# Altium footprint library Binh.PcbLib: 863 footprints (part 42 of 54)
Each footprint in its own frame and in the unit in brackets; x right, y up, seen from the top. Pads: shape width x height; smd on the part's side, far side on the other; paste and mask are expansions set on the pad; w line width, h text height; cw(c..) or ccw(c..) is an arc to the next point about the centre after c.
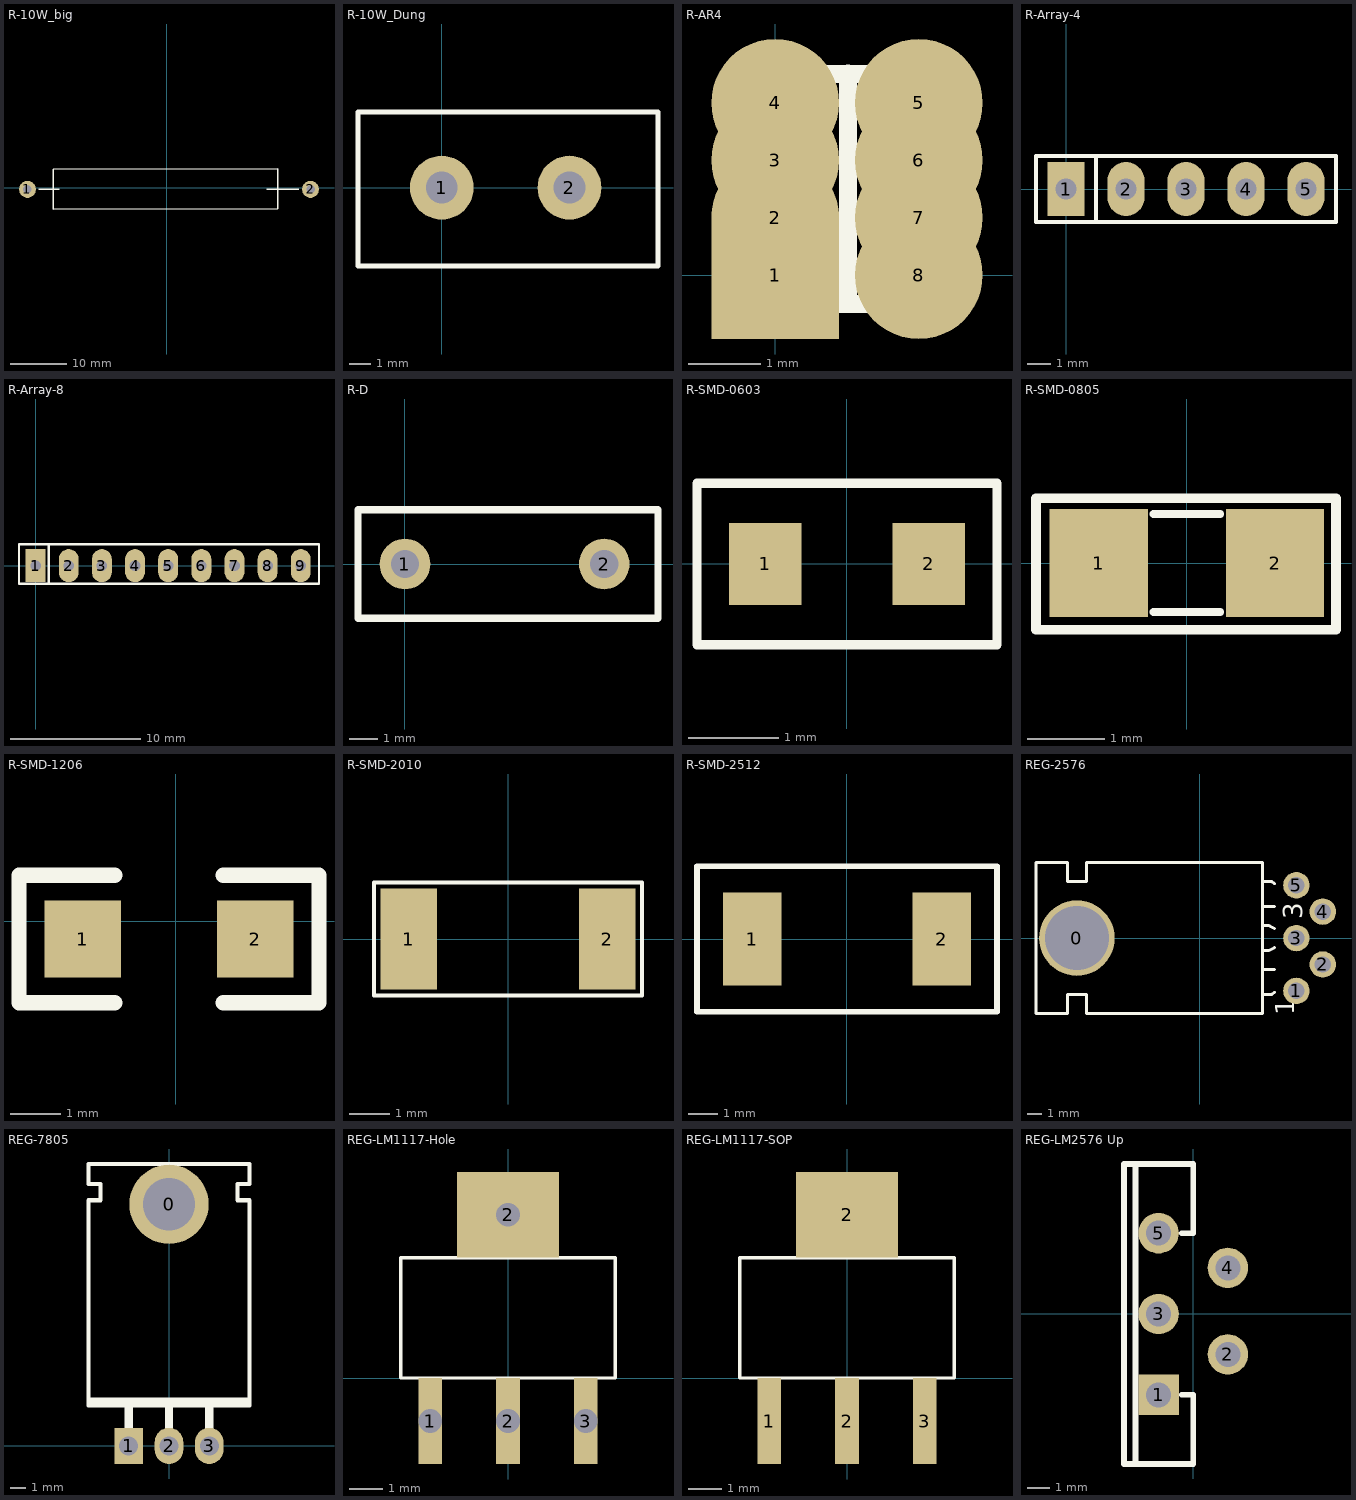
[diagram p41: the footprints below, top view; thin cyan lines are the x and y axes]

## R-10W_big [mm]
pads (2):
  round 3 hole 1.5 unplated: 1(-24.638,-0.254) 2(25.362,-0.254)
Top Overlay:
  lines w0.254: -22.606,-0.254 -19.05,-0.254 ; 17.653,-0.254 23.241,-0.254 ; -20.066,-3.81 -20.066,-0.254 -20.066,3.302 19.558,3.429 19.558,-3.683 -20.066,-3.81

## R-10W_Dung [mm]
pads (2):
  round 3 hole 1.5 unplated: 1(0,0) 2(6,0)
Top Overlay:
  lines w0.254: -3.937,-3.683 10.16,-3.683 10.16,3.556 -3.937,3.556 -3.937,0 -3.937,-3.683

## R-AR4 [mil]
pads (8):
  rect 70x70 smd: 1(0,0)
  round 70 smd: 2(0,31.5) 3(0,62.99) 4(0,94.49) 5(78.74,94.49) 6(78.74,62.99) 7(78.74,31.5) 8(78.74,0)
Top Overlay:
  lines w10: 18.49,-15.75 62.99,-15.75 ; 19.68,110.24 59.05,110.24 ; 39.85,-15.39 39.85,110.59

## R-Array-4 [mil] "R SIP4, 5 Pin"
height 200
pads (5):
  rect 62x90 hole 35: 1(0,0)
  oval 62x90 hole 35: 2(100,0) 3(200,0) 4(300,0) 5(400,0)
Top Overlay:
  lines w7: 50,-55 50,55 ; -50,-55 450,-55 450,55 -50,55 -50,-55
3D body "R_array 5A474J.STEP": height 261.02, standoff -76.77, extent -49.94,-48.82 449.93,50

## R-Array-8 [mil] "R SIP8, 9 Pin"
height 200
pads (9):
  rect 60x100 hole 32: 1(0,0)
  oval 60x100 hole 32: 2(100,0) 3(200,0) 4(300,0) 5(400,0) 6(500,0) 7(600,0) 8(700,0) 9(800,0)
Top Overlay:
  lines w7: 40,-55 40,65 ; -50,-55 855,-55 855,65 -50,65 -50,-55
3D body "SW3dPS-Resistor Networks-1.STEP": height 259.29, standoff -75.35, extent -42.91,-20 842.91,29.21

## R-D [mil]
pads (2):
  round 70 hole 39.37 unplated: 1(0,0) 2(275.59,0)
Top Overlay:
  lines w10: -50,75 350,75 350,-75 -65,-75 -65,75 -35,75

## R-SMD-0603 [mm]
pads (2):
  rect 0.8x0.9 smd: 1(-0.9,0) 2(0.9,0)
Top Overlay:
  lines w0.1: -1.651,-0.889 -1.651,-0.254 -1.651,0.889 1.651,0.889 1.651,-0.889 -1.651,-0.889
3D body "R_0603.STEP": height 0.5, standoff 0, extent -0.8,-0.45 0.8,0.45

## R-SMD-0805 [mil] "Resistor Compoment SMD 80x50mil"
height 50
pads (2):
  rect 50x55 smd: 1(-45,0) 2(45,0)
Top Overlay:
  lines w4: -17,-25 17,-25 ; -17,25 17,25
  lines w5: -77,-34 -77,33 76,33 76,-34 -77,-34
3D body "R_0805.STEP": height 19.68, standoff 0, extent -39.37,-25 39.37,24.21

## R-SMD-1206 [mil] "Resistor SMD 1206"
pads (2):
  rect 60x60 smd: 1(-72.68,-13.74) 2(62.32,-13.74)
Top Overlay:
  lines w12: -47.68,-63.74 -122.68,-63.74 -122.68,36.26 -47.68,36.26 ; 37.32,-63.74 112.32,-63.74 112.32,36.26 37.32,36.26
3D body "R_1206.STEP": height 23.62, standoff 0, extent -67.99,-46.5 57.99,16.5

## R-SMD-2010 [mm]
pads (2):
  rect 1.4x2.5 smd: 1(-2.45,0) 2(2.45,0)
Top Overlay:
  lines w0.1: -3.302,-1.397 -3.302,-0.402 -3.302,1.397 3.302,1.397 3.302,-1.397 -3.302,-1.397
3D body "R_2010.STEP": height 0.6, standoff 0, extent -2.5,-1.25 2.5,1.25

## R-SMD-2512 [mm]
pads (2):
  rect 2x3.2 smd: 1(-3.25,0) 2(3.25,0)
Top Overlay:
  lines w0.2: -5.15,-2.5 5.15,-2.5 5.15,2.5 -5.15,2.5 -5.15,0 -5.15,-2.5
3D body "R_2512.STEP": height -0.39, standoff -0.99, extent -3.2,-1.6 3.2,1.6

## REG-2576 [mil]
pads (6):
  round 200 hole 170: 0(-325.83,0)
  round 70 hole 43.31: 1(255.83,-140) 2(325.83,-70) 3(255.83,0) 4(325.83,70) 5(255.83,140)
Top Overlay:
  lines w7.87: 165.83,-150 190.83,-150 ; 165.83,-83.33 198.44,-83.33 ; 165.83,-33.33 182.5,-33.33 198.44,-25 ; 165.83,33.33 182.5,33.33 198.44,25 ; 165.83,83.33 198.44,83.33 ; 165.83,150 190.83,150 ; 189.89,150.31 198.44,143.9 ; 192.09,-148.11 198.44,-143.58 ; -434.17,-200 -350.84,-200 -350.84,-150 -300.84,-150 -300.84,-200 165.83,-200 165.83,200 -300.84,200 -300.84,150 -350.84,150 -350.84,200 -434.17,200 -434.17,-200
  text "1" at 250.83,-205 h50
  text "3" at 270.83,50 h50

## REG-7805 [mm] "TO, Thru-Hole, Vertical, Heatsink Mounted; 3 In-Line Leads; Pitch 2.54 mm; Pin sequence 1, 3, 2"
height 16.4
pads (4):
  round 5 hole 3.3: 0(0,15.24)
  rect 1.8x2.286 hole 1.2: 1(-2.54,0)
  oval 1.8x2.286 hole 1.2: 2(0,0) 3(2.54,0)
Top Overlay:
  circle w0.203: c0,15.24 r1.27
  rectangle: -0.254,0.762 0.254,2.54
  region: 2.794,2.54 2.286,2.54 2.286,0.762 2.794,0.762
  rectangle: -2.794,0.762 -2.286,2.54
  rectangle: -5.08,2.54 5.08,3.048
  lines w0.254: -5.08,2.54 -5.08,15.494 -4.318,15.494 -4.318,16.51 -5.08,16.51 -5.08,17.78 5.08,17.78 5.08,16.51 4.318,16.51 4.318,15.494 5.08,15.494 5.08,2.54 -5.08,2.54

## REG-LM1117-Hole [mm]
pads (4):
  rect 0.7x2.54 hole 0.7: 1(-2.3,-1.27) 2(0,-1.27) 3(2.3,-1.27)
  rect 3x2.54 hole 0.7: 2(0,4.826)
Top Overlay:
  lines w0.1: -3.175,0 -3.175,3.556 3.175,3.556 3.175,0 -3.175,0
3D body "SW3DPS-SOT-223-DEFAULT.step": height 1.68, standoff 0, extent -3.25,-1.702 3.25,5.258

## REG-LM1117-SOP [mm]
pads (4):
  rect 0.7x2.54 smd: 1(-2.3,-1.27) 2(0,-1.27) 3(2.3,-1.27)
  rect 3x2.54 smd: 2(0,4.826)
Top Overlay:
  lines w0.1: -3.175,0 3.175,0 3.175,3.556 -3.175,3.556 -3.175,0
3D body "SW3DPS-SOT-223-DEFAULT.step": height 1.68, standoff 0, extent -3.25,-1.778 3.25,5.182

## REG-LM2576 Up [mil] "IC nguon LM2576"
pads (5):
  rect 70x70 hole 43.31: 1(-60,-140)
  round 70 hole 43.31: 2(60,-70) 3(-60,0) 4(60,80) 5(-60,140)
Top Overlay:
  lines w10: -100,-260 -100,260 ; -20,-140 0,-140 0,-260 -120,-260 -120,260 0,260 0,140 -20,140